# Altium footprint library 1.27贴片排母.PcbLib: 30 footprints (part 2 of 2)
Each footprint in its own frame and in the unit in brackets; x right, y up, seen from the top. Pads: shape width x height; smd on the part's side, far side on the other; paste and mask are expansions set on the pad; w line width, h text height; cw(c..) or ccw(c..) is an arc to the next point about the centre after c.
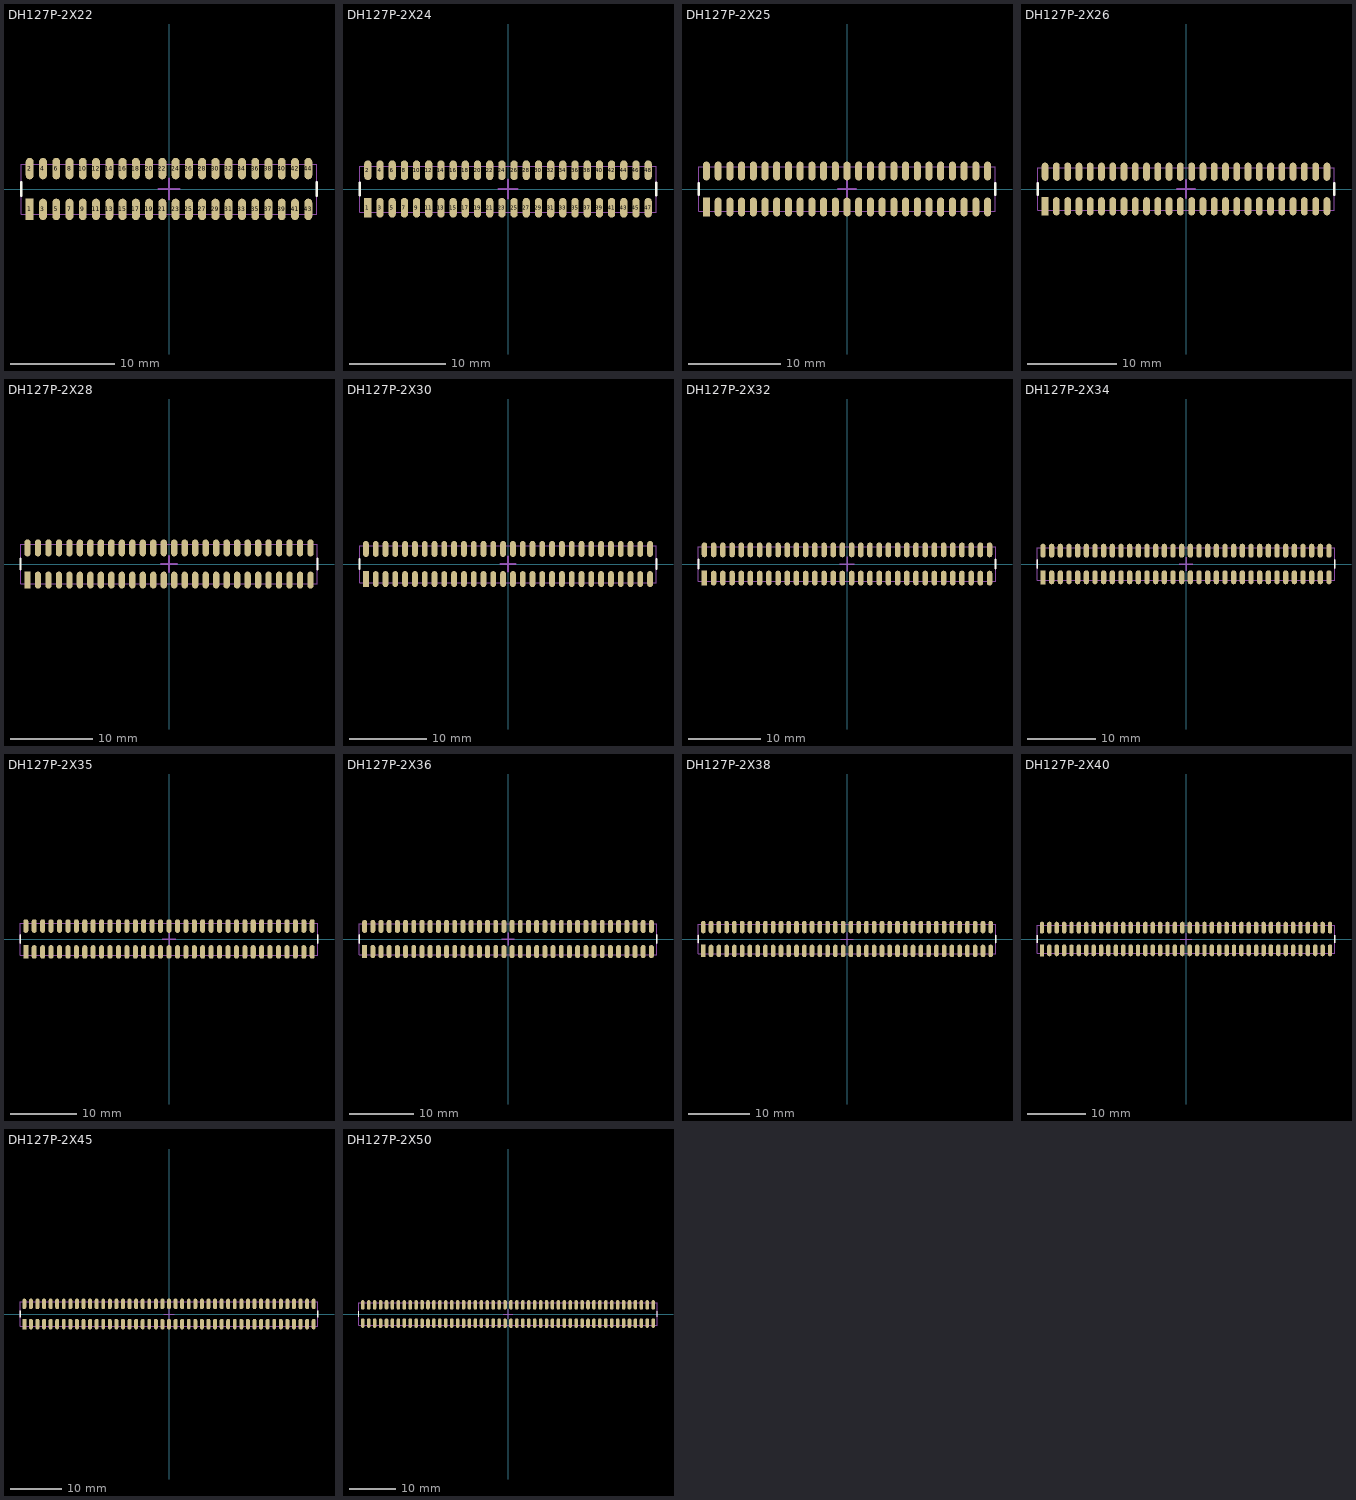
[diagram p1: the footprints below, top view; thin cyan lines are the x and y axes]

## DH127P-2X22 [mm] "1.27mm脚距双排母"
height 3.6
pads (44):
  rect 0.76x2.05 smd: 1(-13.335,-1.95)
  oval 0.76x2.05 smd: 2(-13.335,1.95) 3(-12.065,-1.95) 4(-12.065,1.95) 5(-10.795,-1.95) 6(-10.795,1.95) 7(-9.525,-1.95) 8(-9.525,1.95) 9(-8.255,-1.95) 10(-8.255,1.95) 11(-6.985,-1.95) 12(-6.985,1.95) 13(-5.715,-1.95) 14(-5.715,1.95) 15(-4.445,-1.95) 16(-4.445,1.95) 17(-3.175,-1.95) 18(-3.175,1.95) 19(-1.905,-1.95) 20(-1.905,1.95) 21(-0.635,-1.95) 22(-0.635,1.95) 23(0.635,-1.95) 24(0.635,1.95) 25(1.905,-1.95) 26(1.905,1.95) 27(3.175,-1.95) 28(3.175,1.95) 29(4.445,-1.95) 30(4.445,1.95) 31(5.715,-1.95) 32(5.715,1.95) 33(6.985,-1.95) 34(6.985,1.95) 35(8.255,-1.95) 36(8.255,1.95) 37(9.525,-1.95) 38(9.525,1.95) 39(10.795,-1.95) 40(10.795,1.95) 41(12.065,-1.95) 42(12.065,1.95) 43(13.335,-1.95) 44(13.335,1.95)
Top Overlay:
  lines w0.254: -14.16,-0.635 -14.16,0.635 ; 14.16,-0.635 14.16,0.635
Mechanical 13:
  lines w0.1: -14.16,-2.413 -14.16,2.387 14.16,2.387 14.16,-2.413 -14.16,-2.413
Mechanical 15:
  lines w0.2: -1,0 1,0 ; 0,-1 0,1
3D body: height 3.6, standoff -0.02, extent -14.16,-2.413 14.16,2.387

## DH127P-2X24 [mm] "1.27mm脚距双排母"
height 3.6
pads (48):
  rect 0.76x2.05 smd: 1(-14.605,-1.95)
  oval 0.76x2.05 smd: 2(-14.605,1.95) 3(-13.335,-1.95) 4(-13.335,1.95) 5(-12.065,-1.95) 6(-12.065,1.95) 7(-10.795,-1.95) 8(-10.795,1.95) 9(-9.525,-1.95) 10(-9.525,1.95) 11(-8.255,-1.95) 12(-8.255,1.95) 13(-6.985,-1.95) 14(-6.985,1.95) 15(-5.715,-1.95) 16(-5.715,1.95) 17(-4.445,-1.95) 18(-4.445,1.95) 19(-3.175,-1.95) 20(-3.175,1.95) 21(-1.905,-1.95) 22(-1.905,1.95) 23(-0.635,-1.95) 24(-0.635,1.95) 25(0.635,-1.95) 26(0.635,1.95) 27(1.905,-1.95) 28(1.905,1.95) 29(3.175,-1.95) 30(3.175,1.95) 31(4.445,-1.95) 32(4.445,1.95) 33(5.715,-1.95) 34(5.715,1.95) 35(6.985,-1.95) 36(6.985,1.95) 37(8.255,-1.95) 38(8.255,1.95) 39(9.525,-1.95) 40(9.525,1.95) 41(10.795,-1.95) 42(10.795,1.95) 43(12.065,-1.95) 44(12.065,1.95) 45(13.335,-1.95) 46(13.335,1.95) 47(14.605,-1.95) 48(14.605,1.95)
Top Overlay:
  lines w0.254: -15.43,-0.635 -15.43,0.635 ; 15.43,-0.635 15.43,0.635
Mechanical 13:
  lines w0.1: -15.43,-2.413 -15.43,2.387 15.43,2.387 15.43,-2.413 -15.43,-2.413
Mechanical 15:
  lines w0.2: -1,0 1,0 ; 0,-1 0,1
3D body: height 3.6, standoff -0.02, extent -15.43,-2.413 15.43,2.387

## DH127P-2X25 [mm] "1.27mm脚距双排母"
height 3.6
pads (50):
  rect 0.76x2.05 smd: 1(-15.24,-1.95)
  oval 0.76x2.05 smd: 2(-15.24,1.95) 3(-13.97,-1.95) 4(-13.97,1.95) 5(-12.7,-1.95) 6(-12.7,1.95) 7(-11.43,-1.95) 8(-11.43,1.95) 9(-10.16,-1.95) 10(-10.16,1.95) 11(-8.89,-1.95) 12(-8.89,1.95) 13(-7.62,-1.95) 14(-7.62,1.95) 15(-6.35,-1.95) 16(-6.35,1.95) 17(-5.08,-1.95) 18(-5.08,1.95) 19(-3.81,-1.95) 20(-3.81,1.95) 21(-2.54,-1.95) 22(-2.54,1.95) 23(-1.27,-1.95) 24(-1.27,1.95) 25(0,-1.95) 26(0,1.95) 27(1.27,-1.95) 28(1.27,1.95) 29(2.54,-1.95) 30(2.54,1.95) 31(3.81,-1.95) 32(3.81,1.95) 33(5.08,-1.95) 34(5.08,1.95) 35(6.35,-1.95) 36(6.35,1.95) 37(7.62,-1.95) 38(7.62,1.95) 39(8.89,-1.95) 40(8.89,1.95) 41(10.16,-1.95) 42(10.16,1.95) 43(11.43,-1.95) 44(11.43,1.95) 45(12.7,-1.95) 46(12.7,1.95) 47(13.97,-1.95) 48(13.97,1.95) 49(15.24,-1.95) 50(15.24,1.95)
Top Overlay:
  lines w0.254: -16.065,-0.635 -16.065,0.635 ; 16.065,-0.635 16.065,0.635
Mechanical 13:
  lines w0.1: -16.065,-2.413 16.065,-2.413 16.065,2.387 -16.065,2.387 -16.065,-2.413
Mechanical 15:
  lines w0.2: -1,0 1,0 ; 0,-1 0,1
3D body: height 3.6, standoff -0.02, extent -16.065,-2.413 16.065,2.387

## DH127P-2X26 [mm] "1.27mm脚距双排母"
height 3.6
pads (52):
  rect 0.76x2.05 smd: 1(-15.875,-1.95)
  oval 0.76x2.05 smd: 2(-15.875,1.95) 3(-14.605,-1.95) 4(-14.605,1.95) 5(-13.335,-1.95) 6(-13.335,1.95) 7(-12.065,-1.95) 8(-12.065,1.95) 9(-10.795,-1.95) 10(-10.795,1.95) 11(-9.525,-1.95) 12(-9.525,1.95) 13(-8.255,-1.95) 14(-8.255,1.95) 15(-6.985,-1.95) 16(-6.985,1.95) 17(-5.715,-1.95) 18(-5.715,1.95) 19(-4.445,-1.95) 20(-4.445,1.95) 21(-3.175,-1.95) 22(-3.175,1.95) 23(-1.905,-1.95) 24(-1.905,1.95) 25(-0.635,-1.95) 26(-0.635,1.95) 27(0.635,-1.95) 28(0.635,1.95) 29(1.905,-1.95) 30(1.905,1.95) 31(3.175,-1.95) 32(3.175,1.95) 33(4.445,-1.95) 34(4.445,1.95) 35(5.715,-1.95) 36(5.715,1.95) 37(6.985,-1.95) 38(6.985,1.95) 39(8.255,-1.95) 40(8.255,1.95) 41(9.525,-1.95) 42(9.525,1.95) 43(10.795,-1.95) 44(10.795,1.95) 45(12.065,-1.95) 46(12.065,1.95) 47(13.335,-1.95) 48(13.335,1.95) 49(14.605,-1.95) 50(14.605,1.95) 51(15.875,-1.95) 52(15.875,1.95)
Top Overlay:
  lines w0.254: -16.7,-0.635 -16.7,0.635 ; 16.7,-0.635 16.7,0.635
Mechanical 13:
  lines w0.1: -16.7,-2.413 -16.7,2.387 16.7,2.387 16.7,-2.413 -16.7,-2.413
Mechanical 15:
  lines w0.2: -1,0 1,0 ; 0,-1 0,1
3D body: height 3.6, standoff -0.02, extent -16.7,-2.413 16.7,2.387

## DH127P-2X28 [mm] "1.27mm脚距双排母"
height 3.6
pads (56):
  rect 0.76x2.05 smd: 1(-17.145,-1.95)
  oval 0.76x2.05 smd: 2(-17.145,1.95) 3(-15.875,-1.95) 4(-15.875,1.95) 5(-14.605,-1.95) 6(-14.605,1.95) 7(-13.335,-1.95) 8(-13.335,1.95) 9(-12.065,-1.95) 10(-12.065,1.95) 11(-10.795,-1.95) 12(-10.795,1.95) 13(-9.525,-1.95) 14(-9.525,1.95) 15(-8.255,-1.95) 16(-8.255,1.95) 17(-6.985,-1.95) 18(-6.985,1.95) 19(-5.715,-1.95) 20(-5.715,1.95) 21(-4.445,-1.95) 22(-4.445,1.95) 23(-3.175,-1.95) 24(-3.175,1.95) 25(-1.905,-1.95) 26(-1.905,1.95) 27(-0.635,-1.95) 28(-0.635,1.95) 29(0.635,-1.95) 30(0.635,1.95) 31(1.905,-1.95) 32(1.905,1.95) 33(3.175,-1.95) 34(3.175,1.95) 35(4.445,-1.95) 36(4.445,1.95) 37(5.715,-1.95) 38(5.715,1.95) 39(6.985,-1.95) 40(6.985,1.95) 41(8.255,-1.95) 42(8.255,1.95) 43(9.525,-1.95) 44(9.525,1.95) 45(10.795,-1.95) 46(10.795,1.95) 47(12.065,-1.95) 48(12.065,1.95) 49(13.335,-1.95) 50(13.335,1.95) 51(14.605,-1.95) 52(14.605,1.95) 53(15.875,-1.95) 54(15.875,1.95) 55(17.145,-1.95) 56(17.145,1.95)
Top Overlay:
  lines w0.254: -17.97,-0.635 -17.97,0.635 ; 17.97,-0.635 17.97,0.635
Mechanical 13:
  lines w0.1: -17.97,-2.413 17.97,-2.413 17.97,2.387 -17.97,2.387 -17.97,-2.413
Mechanical 15:
  lines w0.2: -1,0 1,0 ; 0,-1 0,1
3D body: height 3.6, standoff -0.02, extent -17.97,-2.413 17.97,2.387

## DH127P-2X30 [mm] "1.27mm脚距双排母"
height 3.6
pads (60):
  rect 0.76x2.05 smd: 1(-18.415,-1.95)
  oval 0.76x2.05 smd: 2(-18.415,1.95) 3(-17.145,-1.95) 4(-17.145,1.95) 5(-15.875,-1.95) 6(-15.875,1.95) 7(-14.605,-1.95) 8(-14.605,1.95) 9(-13.335,-1.95) 10(-13.335,1.95) 11(-12.065,-1.95) 12(-12.065,1.95) 13(-10.795,-1.95) 14(-10.795,1.95) 15(-9.525,-1.95) 16(-9.525,1.95) 17(-8.255,-1.95) 18(-8.255,1.95) 19(-6.985,-1.95) 20(-6.985,1.95) 21(-5.715,-1.95) 22(-5.715,1.95) 23(-4.445,-1.95) 24(-4.445,1.95) 25(-3.175,-1.95) 26(-3.175,1.95) 27(-1.905,-1.95) 28(-1.905,1.95) 29(-0.635,-1.95) 30(-0.635,1.95) 31(0.635,-1.95) 32(0.635,1.95) 33(1.905,-1.95) 34(1.905,1.95) 35(3.175,-1.95) 36(3.175,1.95) 37(4.445,-1.95) 38(4.445,1.95) 39(5.715,-1.95) 40(5.715,1.95) 41(6.985,-1.95) 42(6.985,1.95) 43(8.255,-1.95) 44(8.255,1.95) 45(9.525,-1.95) 46(9.525,1.95) 47(10.795,-1.95) 48(10.795,1.95) 49(12.065,-1.95) 50(12.065,1.95) 51(13.335,-1.95) 52(13.335,1.95) 53(14.605,-1.95) 54(14.605,1.95) 55(15.875,-1.95) 56(15.875,1.95) 57(17.145,-1.95) 58(17.145,1.95) 59(18.415,-1.95) 60(18.415,1.95)
Top Overlay:
  lines w0.254: -19.24,-0.635 -19.24,0.635 ; 19.24,-0.635 19.24,0.635
Mechanical 13:
  lines w0.1: -19.24,-2.413 19.24,-2.413 19.24,2.387 -19.24,2.387 -19.24,-2.413
Mechanical 15:
  lines w0.2: -1,0 1,0 ; 0,-1 0,1
3D body: height 3.6, standoff -0.02, extent -19.24,-2.413 19.24,2.387

## DH127P-2X32 [mm] "1.27mm脚距双排母"
height 3.6
pads (64):
  rect 0.76x2.05 smd: 1(-19.685,-1.95)
  oval 0.76x2.05 smd: 2(-19.685,1.95) 3(-18.415,-1.95) 4(-18.415,1.95) 5(-17.145,-1.95) 6(-17.145,1.95) 7(-15.875,-1.95) 8(-15.875,1.95) 9(-14.605,-1.95) 10(-14.605,1.95) 11(-13.335,-1.95) 12(-13.335,1.95) 13(-12.065,-1.95) 14(-12.065,1.95) 15(-10.795,-1.95) 16(-10.795,1.95) 17(-9.525,-1.95) 18(-9.525,1.95) 19(-8.255,-1.95) 20(-8.255,1.95) 21(-6.985,-1.95) 22(-6.985,1.95) 23(-5.715,-1.95) 24(-5.715,1.95) 25(-4.445,-1.95) 26(-4.445,1.95) 27(-3.175,-1.95) 28(-3.175,1.95) 29(-1.905,-1.95) 30(-1.905,1.95) 31(-0.635,-1.95) 32(-0.635,1.95) 33(0.635,-1.95) 34(0.635,1.95) 35(1.905,-1.95) 36(1.905,1.95) 37(3.175,-1.95) 38(3.175,1.95) 39(4.445,-1.95) 40(4.445,1.95) 41(5.715,-1.95) 42(5.715,1.95) 43(6.985,-1.95) 44(6.985,1.95) 45(8.255,-1.95) 46(8.255,1.95) 47(9.525,-1.95) 48(9.525,1.95) 49(10.795,-1.95) 50(10.795,1.95) 51(12.065,-1.95) 52(12.065,1.95) 53(13.335,-1.95) 54(13.335,1.95) 55(14.605,-1.95) 56(14.605,1.95) 57(15.875,-1.95) 58(15.875,1.95) 59(17.145,-1.95) 60(17.145,1.95) 61(18.415,-1.95) 62(18.415,1.95) 63(19.685,-1.95) 64(19.685,1.95)
Top Overlay:
  lines w0.254: -20.51,-0.635 -20.51,0.635 ; 20.51,-0.635 20.51,0.635
Mechanical 13:
  lines w0.1: -20.51,-2.413 -20.51,2.387 20.51,2.387 20.51,-2.413 -20.51,-2.413
Mechanical 15:
  lines w0.2: -1,0 1,0 ; 0,-1 0,1
3D body: height 3.6, standoff -0.02, extent -20.51,-2.413 20.51,2.387

## DH127P-2X34 [mm] "1.27mm脚距双排母"
height 3.6
pads (68):
  rect 0.76x2.05 smd: 1(-20.955,-1.95)
  oval 0.76x2.05 smd: 2(-20.955,1.95) 3(-19.685,-1.95) 4(-19.685,1.95) 5(-18.415,-1.95) 6(-18.415,1.95) 7(-17.145,-1.95) 8(-17.145,1.95) 9(-15.875,-1.95) 10(-15.875,1.95) 11(-14.605,-1.95) 12(-14.605,1.95) 13(-13.335,-1.95) 14(-13.335,1.95) 15(-12.065,-1.95) 16(-12.065,1.95) 17(-10.795,-1.95) 18(-10.795,1.95) 19(-9.525,-1.95) 20(-9.525,1.95) 21(-8.255,-1.95) 22(-8.255,1.95) 23(-6.985,-1.95) 24(-6.985,1.95) 25(-5.715,-1.95) 26(-5.715,1.95) 27(-4.445,-1.95) 28(-4.445,1.95) 29(-3.175,-1.95) 30(-3.175,1.95) 31(-1.905,-1.95) 32(-1.905,1.95) 33(-0.635,-1.95) 34(-0.635,1.95) 35(0.635,-1.95) 36(0.635,1.95) 37(1.905,-1.95) 38(1.905,1.95) 39(3.175,-1.95) 40(3.175,1.95) 41(4.445,-1.95) 42(4.445,1.95) 43(5.715,-1.95) 44(5.715,1.95) 45(6.985,-1.95) 46(6.985,1.95) 47(8.255,-1.95) 48(8.255,1.95) 49(9.525,-1.95) 50(9.525,1.95) 51(10.795,-1.95) 52(10.795,1.95) 53(12.065,-1.95) 54(12.065,1.95) 55(13.335,-1.95) 56(13.335,1.95) 57(14.605,-1.95) 58(14.605,1.95) 59(15.875,-1.95) 60(15.875,1.95) 61(17.145,-1.95) 62(17.145,1.95) 63(18.415,-1.95) 64(18.415,1.95) 65(19.685,-1.95) 66(19.685,1.95) 67(20.955,-1.95) 68(20.955,1.95)
Top Overlay:
  lines w0.254: -21.78,-0.635 -21.78,0.635 ; 21.78,-0.635 21.78,0.635
Mechanical 13:
  lines w0.1: -21.78,-2.413 21.78,-2.413 21.78,2.387 -21.78,2.387 -21.78,-2.413
Mechanical 15:
  lines w0.2: -1,0 1,0 ; 0,-1 0,1
3D body: height 3.6, standoff -0.02, extent -21.78,-2.413 21.78,2.387

## DH127P-2X35 [mm] "1.27mm脚距双排母"
height 3.6
pads (70):
  rect 0.76x2.05 smd: 1(-21.59,-1.95)
  oval 0.76x2.05 smd: 2(-21.59,1.95) 3(-20.32,-1.95) 4(-20.32,1.95) 5(-19.05,-1.95) 6(-19.05,1.95) 7(-17.78,-1.95) 8(-17.78,1.95) 9(-16.51,-1.95) 10(-16.51,1.95) 11(-15.24,-1.95) 12(-15.24,1.95) 13(-13.97,-1.95) 14(-13.97,1.95) 15(-12.7,-1.95) 16(-12.7,1.95) 17(-11.43,-1.95) 18(-11.43,1.95) 19(-10.16,-1.95) 20(-10.16,1.95) 21(-8.89,-1.95) 22(-8.89,1.95) 23(-7.62,-1.95) 24(-7.62,1.95) 25(-6.35,-1.95) 26(-6.35,1.95) 27(-5.08,-1.95) 28(-5.08,1.95) 29(-3.81,-1.95) 30(-3.81,1.95) 31(-2.54,-1.95) 32(-2.54,1.95) 33(-1.27,-1.95) 34(-1.27,1.95) 35(0,-1.95) 36(0,1.95) 37(1.27,-1.95) 38(1.27,1.95) 39(2.54,-1.95) 40(2.54,1.95) 41(3.81,-1.95) 42(3.81,1.95) 43(5.08,-1.95) 44(5.08,1.95) 45(6.35,-1.95) 46(6.35,1.95) 47(7.62,-1.95) 48(7.62,1.95) 49(8.89,-1.95) 50(8.89,1.95) 51(10.16,-1.95) 52(10.16,1.95) 53(11.43,-1.95) 54(11.43,1.95) 55(12.7,-1.95) 56(12.7,1.95) 57(13.97,-1.95) 58(13.97,1.95) 59(15.24,-1.95) 60(15.24,1.95) 61(16.51,-1.95) 62(16.51,1.95) 63(17.78,-1.95) 64(17.78,1.95) 65(19.05,-1.95) 66(19.05,1.95) 67(20.32,-1.95) 68(20.32,1.95) 69(21.59,-1.95) 70(21.59,1.95)
Top Overlay:
  lines w0.254: -22.415,-0.635 -22.415,0.635 ; 22.415,-0.635 22.415,0.635
Mechanical 13:
  lines w0.1: -22.415,-2.413 22.415,-2.413 22.415,2.387 -22.415,2.387 -22.415,-2.413
Mechanical 15:
  lines w0.2: -1,0 1,0 ; 0,-1 0,1
3D body: height 3.6, standoff -0.02, extent -22.415,-2.413 22.415,2.387

## DH127P-2X36 [mm] "1.27mm脚距双排母"
height 3.6
pads (72):
  rect 0.76x2.05 smd: 1(-22.225,-1.95)
  oval 0.76x2.05 smd: 2(-22.225,1.95) 3(-20.955,-1.95) 4(-20.955,1.95) 5(-19.685,-1.95) 6(-19.685,1.95) 7(-18.415,-1.95) 8(-18.415,1.95) 9(-17.145,-1.95) 10(-17.145,1.95) 11(-15.875,-1.95) 12(-15.875,1.95) 13(-14.605,-1.95) 14(-14.605,1.95) 15(-13.335,-1.95) 16(-13.335,1.95) 17(-12.065,-1.95) 18(-12.065,1.95) 19(-10.795,-1.95) 20(-10.795,1.95) 21(-9.525,-1.95) 22(-9.525,1.95) 23(-8.255,-1.95) 24(-8.255,1.95) 25(-6.985,-1.95) 26(-6.985,1.95) 27(-5.715,-1.95) 28(-5.715,1.95) 29(-4.445,-1.95) 30(-4.445,1.95) 31(-3.175,-1.95) 32(-3.175,1.95) 33(-1.905,-1.95) 34(-1.905,1.95) 35(-0.635,-1.95) 36(-0.635,1.95) 37(0.635,-1.95) 38(0.635,1.95) 39(1.905,-1.95) 40(1.905,1.95) 41(3.175,-1.95) 42(3.175,1.95) 43(4.445,-1.95) 44(4.445,1.95) 45(5.715,-1.95) 46(5.715,1.95) 47(6.985,-1.95) 48(6.985,1.95) 49(8.255,-1.95) 50(8.255,1.95) 51(9.525,-1.95) 52(9.525,1.95) 53(10.795,-1.95) 54(10.795,1.95) 55(12.065,-1.95) 56(12.065,1.95) 57(13.335,-1.95) 58(13.335,1.95) 59(14.605,-1.95) 60(14.605,1.95) 61(15.875,-1.95) 62(15.875,1.95) 63(17.145,-1.95) 64(17.145,1.95) 65(18.415,-1.95) 66(18.415,1.95) 67(19.685,-1.95) 68(19.685,1.95) 69(20.955,-1.95) 70(20.955,1.95) 71(22.225,-1.95) 72(22.225,1.95)
Top Overlay:
  lines w0.254: -23.05,-0.635 -23.05,0.635 ; 23.05,-0.635 23.05,0.635
Mechanical 13:
  lines w0.1: -23.05,-2.413 -23.05,2.387 23.05,2.387 23.05,-2.413 -23.05,-2.413
Mechanical 15:
  lines w0.2: -1,0 1,0 ; 0,-1 0,1
3D body: height 3.6, standoff -0.02, extent -23.05,-2.413 23.05,2.387

## DH127P-2X38 [mm] "1.27mm脚距双排母"
height 3.6
pads (76):
  rect 0.76x2.05 smd: 1(-23.495,-1.95)
  oval 0.76x2.05 smd: 2(-23.495,1.95) 3(-22.225,-1.95) 4(-22.225,1.95) 5(-20.955,-1.95) 6(-20.955,1.95) 7(-19.685,-1.95) 8(-19.685,1.95) 9(-18.415,-1.95) 10(-18.415,1.95) 11(-17.145,-1.95) 12(-17.145,1.95) 13(-15.875,-1.95) 14(-15.875,1.95) 15(-14.605,-1.95) 16(-14.605,1.95) 17(-13.335,-1.95) 18(-13.335,1.95) 19(-12.065,-1.95) 20(-12.065,1.95) 21(-10.795,-1.95) 22(-10.795,1.95) 23(-9.525,-1.95) 24(-9.525,1.95) 25(-8.255,-1.95) 26(-8.255,1.95) 27(-6.985,-1.95) 28(-6.985,1.95) 29(-5.715,-1.95) 30(-5.715,1.95) 31(-4.445,-1.95) 32(-4.445,1.95) 33(-3.175,-1.95) 34(-3.175,1.95) 35(-1.905,-1.95) 36(-1.905,1.95) 37(-0.635,-1.95) 38(-0.635,1.95) 39(0.635,-1.95) 40(0.635,1.95) 41(1.905,-1.95) 42(1.905,1.95) 43(3.175,-1.95) 44(3.175,1.95) 45(4.445,-1.95) 46(4.445,1.95) 47(5.715,-1.95) 48(5.715,1.95) 49(6.985,-1.95) 50(6.985,1.95) 51(8.255,-1.95) 52(8.255,1.95) 53(9.525,-1.95) 54(9.525,1.95) 55(10.795,-1.95) 56(10.795,1.95) 57(12.065,-1.95) 58(12.065,1.95) 59(13.335,-1.95) 60(13.335,1.95) 61(14.605,-1.95) 62(14.605,1.95) 63(15.875,-1.95) 64(15.875,1.95) 65(17.145,-1.95) 66(17.145,1.95) 67(18.415,-1.95) 68(18.415,1.95) 69(19.685,-1.95) 70(19.685,1.95) 71(20.955,-1.95) 72(20.955,1.95) 73(22.225,-1.95) 74(22.225,1.95) 75(23.495,-1.95) 76(23.495,1.95)
Top Overlay:
  lines w0.254: -24.32,-0.635 -24.32,0.635 ; 24.32,-0.635 24.32,0.635
Mechanical 13:
  lines w0.1: -24.32,-2.413 -24.32,2.387 24.32,2.387 24.32,-2.413 -24.32,-2.413
Mechanical 15:
  lines w0.2: -1,0 1,0 ; 0,-1 0,1
3D body: height 3.6, standoff -0.02, extent -24.32,-2.413 24.32,2.387

## DH127P-2X40 [mm] "1.27mm脚距双排母"
height 3.6
pads (80):
  rect 0.76x2.05 smd: 1(-24.765,-1.95)
  oval 0.76x2.05 smd: 2(-24.765,1.95) 3(-23.495,-1.95) 4(-23.495,1.95) 5(-22.225,-1.95) 6(-22.225,1.95) 7(-20.955,-1.95) 8(-20.955,1.95) 9(-19.685,-1.95) 10(-19.685,1.95) 11(-18.415,-1.95) 12(-18.415,1.95) 13(-17.145,-1.95) 14(-17.145,1.95) 15(-15.875,-1.95) 16(-15.875,1.95) 17(-14.605,-1.95) 18(-14.605,1.95) 19(-13.335,-1.95) 20(-13.335,1.95) 21(-12.065,-1.95) 22(-12.065,1.95) 23(-10.795,-1.95) 24(-10.795,1.95) 25(-9.525,-1.95) 26(-9.525,1.95) 27(-8.255,-1.95) 28(-8.255,1.95) 29(-6.985,-1.95) 30(-6.985,1.95) 31(-5.715,-1.95) 32(-5.715,1.95) 33(-4.445,-1.95) 34(-4.445,1.95) 35(-3.175,-1.95) 36(-3.175,1.95) 37(-1.905,-1.95) 38(-1.905,1.95) 39(-0.635,-1.95) 40(-0.635,1.95) 41(0.635,-1.95) 42(0.635,1.95) 43(1.905,-1.95) 44(1.905,1.95) 45(3.175,-1.95) 46(3.175,1.95) 47(4.445,-1.95) 48(4.445,1.95) 49(5.715,-1.95) 50(5.715,1.95) 51(6.985,-1.95) 52(6.985,1.95) 53(8.255,-1.95) 54(8.255,1.95) 55(9.525,-1.95) 56(9.525,1.95) 57(10.795,-1.95) 58(10.795,1.95) 59(12.065,-1.95) 60(12.065,1.95) 61(13.335,-1.95) 62(13.335,1.95) 63(14.605,-1.95) 64(14.605,1.95) 65(15.875,-1.95) 66(15.875,1.95) 67(17.145,-1.95) 68(17.145,1.95) 69(18.415,-1.95) 70(18.415,1.95) 71(19.685,-1.95) 72(19.685,1.95) 73(20.955,-1.95) 74(20.955,1.95) 75(22.225,-1.95) 76(22.225,1.95) 77(23.495,-1.95) 78(23.495,1.95) 79(24.765,-1.95) 80(24.765,1.95)
Top Overlay:
  lines w0.254: -25.59,-0.635 -25.59,0.635 ; 25.59,-0.635 25.59,0.635
Mechanical 13:
  lines w0.1: -25.59,-2.413 -25.59,2.387 25.59,2.387 25.59,-2.413 -25.59,-2.413
Mechanical 15:
  lines w0.2: -1,0 1,0 ; 0,-1 0,1
3D body: height 3.6, standoff -0.02, extent -25.59,-2.413 25.59,2.387

## DH127P-2X45 [mm] "1.27mm脚距双排母"
height 3.6
pads (90):
  rect 0.76x2.05 smd: 1(-27.94,-1.95)
  oval 0.76x2.05 smd: 2(-27.94,1.95) 3(-26.67,-1.95) 4(-26.67,1.95) 5(-25.4,-1.95) 6(-25.4,1.95) 7(-24.13,-1.95) 8(-24.13,1.95) 9(-22.86,-1.95) 10(-22.86,1.95) 11(-21.59,-1.95) 12(-21.59,1.95) 13(-20.32,-1.95) 14(-20.32,1.95) 15(-19.05,-1.95) 16(-19.05,1.95) 17(-17.78,-1.95) 18(-17.78,1.95) 19(-16.51,-1.95) 20(-16.51,1.95) 21(-15.24,-1.95) 22(-15.24,1.95) 23(-13.97,-1.95) 24(-13.97,1.95) 25(-12.7,-1.95) 26(-12.7,1.95) 27(-11.43,-1.95) 28(-11.43,1.95) 29(-10.16,-1.95) 30(-10.16,1.95) 31(-8.89,-1.95) 32(-8.89,1.95) 33(-7.62,-1.95) 34(-7.62,1.95) 35(-6.35,-1.95) 36(-6.35,1.95) 37(-5.08,-1.95) 38(-5.08,1.95) 39(-3.81,-1.95) 40(-3.81,1.95) 41(-2.54,-1.95) 42(-2.54,1.95) 43(-1.27,-1.95) 44(-1.27,1.95) 45(0,-1.95) 46(0,1.95) 47(1.27,-1.95) 48(1.27,1.95) 49(2.54,-1.95) 50(2.54,1.95) 51(3.81,-1.95) 52(3.81,1.95) 53(5.08,-1.95) 54(5.08,1.95) 55(6.35,-1.95) 56(6.35,1.95) 57(7.62,-1.95) 58(7.62,1.95) 59(8.89,-1.95) 60(8.89,1.95) 61(10.16,-1.95) 62(10.16,1.95) 63(11.43,-1.95) 64(11.43,1.95) 65(12.7,-1.95) 66(12.7,1.95) 67(13.97,-1.95) 68(13.97,1.95) 69(15.24,-1.95) 70(15.24,1.95) 71(16.51,-1.95) 72(16.51,1.95) 73(17.78,-1.95) 74(17.78,1.95) 75(19.05,-1.95) 76(19.05,1.95) 77(20.32,-1.95) 78(20.32,1.95) 79(21.59,-1.95) 80(21.59,1.95) 81(22.86,-1.95) 82(22.86,1.95) 83(24.13,-1.95) 84(24.13,1.95) 85(25.4,-1.95) 86(25.4,1.95) 87(26.67,-1.95) 88(26.67,1.95) 89(27.94,-1.95) 90(27.94,1.95)
Top Overlay:
  lines w0.254: -28.765,-0.635 -28.765,0.635 ; 28.765,-0.635 28.765,0.635
Mechanical 13:
  lines w0.1: -28.765,-2.413 -28.765,2.387 28.765,2.387 28.765,-2.413 -28.765,-2.413
Mechanical 15:
  lines w0.2: -1,0 1,0 ; 0,-1 0,1
3D body: height 3.6, standoff -0.02, extent -28.765,-2.413 28.765,2.387

## DH127P-2X50 [mm] "1.27mm脚距双排母"
height 3.6
pads (100):
  oval 0.76x2.05 smd: 1(-31.115,-1.95) 2(-31.115,1.95) 3(-29.845,-1.95) 4(-29.845,1.95) 5(-28.575,-1.95) 6(-28.575,1.95) 7(-27.305,-1.95) 8(-27.305,1.95) 9(-26.035,-1.95) 10(-26.035,1.95) 11(-24.765,-1.95) 12(-24.765,1.95) 13(-23.495,-1.95) 14(-23.495,1.95) 15(-22.225,-1.95) 16(-22.225,1.95) 17(-20.955,-1.95) 18(-20.955,1.95) 19(-19.685,-1.95) 20(-19.685,1.95) 21(-18.415,-1.95) 22(-18.415,1.95) 23(-17.145,-1.95) 24(-17.145,1.95) 25(-15.875,-1.95) 26(-15.875,1.95) 27(-14.605,-1.95) 28(-14.605,1.95) 29(-13.335,-1.95) 30(-13.335,1.95) 31(-12.065,-1.95) 32(-12.065,1.95) 33(-10.795,-1.95) 34(-10.795,1.95) 35(-9.525,-1.95) 36(-9.525,1.95) 37(-8.255,-1.95) 38(-8.255,1.95) 39(-6.985,-1.95) 40(-6.985,1.95) 41(-5.715,-1.95) 42(-5.715,1.95) 43(-4.445,-1.95) 44(-4.445,1.95) 45(-3.175,-1.95) 46(-3.175,1.95) 47(-1.905,-1.95) 48(-1.905,1.95) 49(-0.635,-1.95) 50(-0.635,1.95) 51(0.635,-1.95) 52(0.635,1.95) 53(1.905,-1.95) 54(1.905,1.95) 55(3.175,-1.95) 56(3.175,1.95) 57(4.445,-1.95) 58(4.445,1.95) 59(5.715,-1.95) 60(5.715,1.95) 61(6.985,-1.95) 62(6.985,1.95) 63(8.255,-1.95) 64(8.255,1.95) 65(9.525,-1.95) 66(9.525,1.95) 67(10.795,-1.95) 68(10.795,1.95) 69(12.065,-1.95) 70(12.065,1.95) 71(13.335,-1.95) 72(13.335,1.95) 73(14.605,-1.95) 74(14.605,1.95) 75(15.875,-1.95) 76(15.875,1.95) 77(17.145,-1.95) 78(17.145,1.95) 79(18.415,-1.95) 80(18.415,1.95) 81(19.685,-1.95) 82(19.685,1.95) 83(20.955,-1.95) 84(20.955,1.95) 85(22.225,-1.95) 86(22.225,1.95) 87(23.495,-1.95) 88(23.495,1.95) 89(24.765,-1.95) 90(24.765,1.95) 91(26.035,-1.95) 92(26.035,1.95) 93(27.305,-1.95) 94(27.305,1.95) 95(28.575,-1.95) 96(28.575,1.95) 97(29.845,-1.95) 98(29.845,1.95) 99(31.115,-1.95) 100(31.115,1.95)
Top Overlay:
  lines w0.254: -31.94,-0.635 -31.94,0.635 ; 31.94,-0.635 31.94,0.635
Mechanical 13:
  lines w0.1: -31.94,-2.4 -31.94,2.4 31.94,2.4 31.94,-2.4 -31.94,-2.4
Mechanical 15:
  lines w0.2: -1,0 1,0 ; 0,-1 0,1
3D body: height 3.6, standoff -0.02, extent -31.94,-2.4 31.94,2.4